# Altium schematic symbol library BARKO_SCHLIB.SchLib: 1064 symbols (part 4 of 11) (continued)
## IC-ADC124S021CIMM/NOPB (continued)
IC ADC 12BIT SAR 10VSSOP; Manufacturer: TI National Semiconductor; Manufacturer Part Number: ADC124S021CIMM/NOPB; Interface: SPI,Serial; Number of A/D Converters: 1; Max Power Dissipation: 11mW; Max Supply Voltage: 5.25V; Min Supply Voltage: 2.7V; Number of Bits: 12; Sampling Rate: 200KS/s; Number of Inputs: 4; Resolution: 12b; Polarity: Unipolar; Signal to Noise Ratio (SNR): 72dB; Operating Supply Voltage: 5V; Nominal Supply Current: 1.5mA; Integral Nonlinearity (INL): -1.1LSB; Power Consumption: 2.2mW; Supplier 1: Digi-Key; Supplier Part Number 1: ADC124S021CIMM/NOPBCT-ND; Stock: 11575; Pricing: 1=3.45, 10=3.094, 25=2.9252, 100=2.405, 250=2.158, 500=2.08 (USD); RoHS: Yes; Mount: Surface Mount; Case/Package: MSOP; Number of Pins: 10; Min Operating Temperature: -40°C; Max Operating Temperature: 85°C; Package Quantity: 1000; Power Dissipation: 11mW; Number of Analog Inputs: 4; Packaging: Tape and Reel; Number of Channels: 4; Number of Converters: 1; Number of Elements: 1; Termination: SMD/SMT; Conversion Rate: 200KS/s; Length: 3mm; Height: 0.86mm; Width: 3mm; Radiation Hardening: No; REACH SVHC: No SVHC; Lead Free: Lead Free; ComponentLink1URL: https://datasheet.ciiva.com/3037/adc124s021-3037889.pdf?src-supplier=Avnet; ComponentLink1Description: https://datasheet.ciiva.com/3037/adc124s021-3037889.pdf?src-supplier=Avnet; ComponentLink2URL: https://datasheet.ciiva.com/41460/001186665-da-01-en-ic-adc-1-adc124s021cimm-nopb-msop-10-tid-41460960.pdf?src-supplier=Conrad; ComponentLink2Description: https://datasheet.ciiva.com/41460/001186665-da-01-en-ic-adc-1-adc124s021cimm-nopb-msop-10-tid-41460960.pdf?src-supplier=Conrad; ComponentLink3URL: https://datasheet.ciiva.com/7988/1919066-7988869.pdf?src-supplier=Element14; ComponentLink3Description: https://datasheet.ciiva.com/7988/1919066-7988869.pdf?src-supplier=Element14; ComponentLink4URL: https://datasheet.ciiva.com/25992/adc124s021-25992264.pdf?src-supplier=Avnet+Europe; ComponentLink4Description: https://datasheet.ciiva.com/25992/adc124s021-25992264.pdf?src-supplier=Avnet+Europe; ComponentLink5URL: https://datasheet.ciiva.com/6666/adc124s021-6666364.pdf?src-supplier=Digi-Key; ComponentLink5Description: https://datasheet.ciiva.com/6666/adc124s021-6666364.pdf?src-supplier=Digi-Key; ComponentLink6URL: https://datasheet.ciiva.com/6666/adc124s021-6666366.pdf?src-supplier=Digi-Key; ComponentLink6Description: https://datasheet.ciiva.com/6666/adc124s021-6666366.pdf?src-supplier=Digi-Key; ComponentLink7URL: https://datasheet.ciiva.com/6666/adc124s021-6666367.pdf?src-supplier=Digi-Key; ComponentLink7Description: https://datasheet.ciiva.com/6666/adc124s021-6666367.pdf?src-supplier=Digi-Key
footprint VSSOP-10 (TSSOP, 10-Leads, Body 3x3mm, Pitch 0.5mm, IPC Low Density)
pins: 1 ~{CS} (in), 2 VA (power), 3 GND (power), 4 IN4 (in), 5 IN3 (in), 6 IN2 (in), 7 IN1 (in), 8 DIN (in), 9 DOUT (out), 10 SCLK (in)

## IC-ADP7142ACPZN-R7
designator IC?, comment ADP7142ACPZN-R7
LDO Regulator Pos 1.5V to 5V 0.2A 6-Pin LFCSP EP T/R; Manufacturer: Analog Devices; Number of Outputs: 1; Max Input Voltage: 40V; Input Bias Current: 1uA; Min Input Voltage: 2.7V; Operating Supply Current: 180uA; Power Supply Rejection Ratio (PSRR): 50dB; Output Type: Adjustable; Polarity: Positive; Quiescent Current: 140uA; Accuracy: 0.8%; Max Output Current: 200mA; Output Voltage: 39.8V; Dropout Voltage: 200mV; Min Current Limit: 250mA; Supplier 1: Mouser; Manufacturer Part Number: ADP7142ACPZN-R7; Stock 1: 18194; Pricing 1: 1=2,91000, 10=2,61000, 25=2,47000, 100=2,03000, 250=1,82000, 500=1,76000 (USD); RoHS: Yes; Mount: Surface Mount; Number of Pins: 6; Contact Plating: Gold; Min Operating Temperature: -40°C; Max Operating Temperature: 125°C; Package Quantity: 3000; Packaging: Tape and Reel; Output Current: 200mA; Number of Regulators: 1; Lead Free: Contains Lead; ComponentLink1URL: http://www.mouser.com/ds/2/609/ADP7142-878904.pdf?src-supplier=Mouser; ComponentLink1Description: http://www.mouser.com/ds/2/609/ADP7142-878904.pdf?src-supplier=Mouser; ComponentLink2URL: https://www.analog.com/media/en/technical-documentation/data-sheets/ADP7142.pdf?src-supplier=Digi-Key; ComponentLink2Description: https://www.analog.com/media/en/technical-documentation/data-sheets/ADP7142.pdf?src-supplier=Digi-Key; ComponentLink3URL: http://www.analog.com/static/imported-files/data_sheets/ADP7142.pdf?src-supplier=Avnet; ComponentLink3Description: http://www.analog.com/static/imported-files/data_sheets/ADP7142.pdf?src-supplier=Avnet; Supplier Part Number 1: 584-ADP7142ACPZN-R7
footprint LFCSP CP-6-3 (6-Lead Lead Frame Chip Scale Package [LFCSP]  2.00 mm × 2.00 mm Body and 0.55 mm Package Height)
pins: 1 VOUT, 2 SNS/ADJ, 3 GND, 4 EN, 5 SS, 6 VIN, 7 EP

## IC-ADS1120IRVAT
designator IC?, comment ADS1120IRVAT
IC ADC CONV 16BIT LP LN 16VQFN; Manufacturer: Texas Instruments; Number of Bits: 16; Sampling Rate: 2000S/s; Number of A/D Converters: 1; Resolution: 16b; Polarity: Bipolar,Unipolar; Supply Type: Analog,Digital; Max Supply Voltage: 5.5V; Dual Supply Voltage: 2.5V; Max Dual Supply Voltage: 2.75V; Power Dissipation: 2.1mW; Min Supply Voltage: 2.3V; Number of Inputs: 4; Interface: SPI; Supplier 1: Arrow; Manufacturer Part Number: ADS1120IRVAT; Stock 1: 95; Pricing 1: 1=4,43700, 10=4,32800, 25=4,25300, 250=4,94100, 2500=4,83200, 25000=4,19000, 125000=3,84500, 250000=3,84200 (USD); RoHS: Yes; Mount: Surface Mount; Case/Package: VQFN; Number of Pins: 16; Contact Plating: Gold; Min Operating Temperature: -40°C; Max Operating Temperature: 125°C; Min Dual Supply Voltage: 2.3V; Package Quantity: 250; Packaging: Cut Tape; Lead Free: Lead Free; ComponentLink1URL: https://datasheet.ciiva.com/29661/ads1120-29661123.pdf?src-supplier=Digi-Key; ComponentLink1Description: https://datasheet.ciiva.com/29661/ads1120-29661123.pdf?src-supplier=Digi-Key; ComponentLink2URL: https://datasheet.ciiva.com/48514/ads1120-48514092.pdf?src-supplier=Avnet; ComponentLink2Description: https://datasheet.ciiva.com/48514/ads1120-48514092.pdf?src-supplier=Avnet; Supplier Part Number 1: ADS1120IRVAT
footprint S-PVQFN-N16 (QFN, 16-Leads, Body 3,50x3,50mm, Pitch 0,50mm, Thermal Pad 2,14x2,14mm, IPC Medium Density)
pins: 1 CLK, 2 DGND (power), 3 AVSS (power), 4 AIN3/REFN1, 5 AIN2, 6 REFNO, 7 REFPO, 8 AIN1, 9 AIN0/REFP1, 10 AVDD (power), 11 DVDD (power), 12 ~{DRDY}, 13 DOUT/~{DRDY}, 14 DIN, 15 SCLK, 16 ~{CS}, 17 EP (power)

## IC-AND-SN74LVC1G08DCKR
designator U?, comment SN74LVC1G08DCKR
IC GATE AND 1CH 2-INP SC70-5; Manufacturer: Texas Instruments; Min Supply Voltage: 1.65V; Max Supply Voltage: 5.5V; Propagation Delay: 4ns; Number of Inputs: 2; Number of Outputs: 1; Low Level Output Current: 32mA; Quiescent Current: 10uA; High Level Output Current: -32mA; Schmitt Trigger Input: No; Washability: OK; .Creator: M.OZKAN; .PCBCHK: USED; Manufacturer Part Number: SN74LVC1G08DCKR; RoHS: Yes; Mount: Surface Mount; Case/Package: SC; Number of Pins: 5; Weight: 8.8E-05oz; Contact Plating: Gold; Min Operating Temperature: -40°C; Max Operating Temperature: 125°C; Logic Function: AND; Packaging: Tape and Reel; Package Quantity: 1; Number of Gates: 1; Number of Input Lines: 2; Number of Output Lines: 1; Number of Circuits: 1; Number of Elements: 1; Turn-On Delay Time: 4ns; Number of Bits: 1; Output Current: 32mA; Max Output Current: 32mA; Termination: SMD/SMT; Length: 2.15mm; Height: 1mm; Width: 1.4mm; Radiation Hardening: No; REACH SVHC: No SVHC; Lead Free: Lead Free; Supplier 1: Digi-Key; Supplier Part Number 1: 296-11602-1-ND; Stock 1: 120042; Pricing 1: 1=0.27000, 10=0.22100, 25=0.18560, 100=0.11740, 250=0.09064, 500=0.07726, 1000=0.05253 (USD); ComponentLink1URL: https://datasheet.ciiva.com/14290/sn74lvc1g08-14290720.pdf?src-supplier=Avnet; ComponentLink1Description: https://datasheet.ciiva.com/14290/sn74lvc1g08-14290720.pdf?src-supplier=Avnet; ComponentLink2URL: https://datasheet.ciiva.com/1864/sn74lvc1g08-1864341.pdf?src-supplier=Digi-Key; ComponentLink2Description: https://datasheet.ciiva.com/1864/sn74lvc1g08-1864341.pdf?src-supplier=Digi-Key; ComponentLink3URL: https://datasheet.ciiva.com/1864/sn74lvc1g08-1864342.pdf?src-supplier=Digi-Key; ComponentLink3Description: https://datasheet.ciiva.com/1864/sn74lvc1g08-1864342.pdf?src-supplier=Digi-Key; ComponentLink4URL: https://datasheet.ciiva.com/1864/sn74lvc1g08-1864343.pdf?src-supplier=Digi-Key; ComponentLink4Description: https://datasheet.ciiva.com/1864/sn74lvc1g08-1864343.pdf?src-supplier=Digi-Key; ComponentLink5URL: https://datasheet.ciiva.com/26048/sn74lvc1g08-26048426.pdf?src-supplier=Avnet+Europe; ComponentLink5Description: https://datasheet.ciiva.com/26048/sn74lvc1g08-26048426.pdf?src-supplier=Avnet+Europe; ComponentLink6URL: https://datasheet.ciiva.com/16503/sn74lvc1g08-16503404.pdf?src-supplier=Avnet+Asia; ComponentLink6Description: https://datasheet.ciiva.com/16503/sn74lvc1g08-16503404.pdf?src-supplier=Avnet+Asia; ComponentLink7URL: https://datasheet.ciiva.com/14290/sn74lvc1g08-14290717.pdf?src-supplier=Avnet; ComponentLink7Description: https://datasheet.ciiva.com/14290/sn74lvc1g08-14290717.pdf?src-supplier=Avnet; ComponentLink8URL: https://datasheet.ciiva.com/28540/1772545-28540798.pdf?src-supplier=Element14; ComponentLink8Description: https://datasheet.ciiva.com/28540/1772545-28540798.pdf?src-supplier=Element14; .SCHCHK: USED
footprint TSSOP5 (SOT23, 5-Leads, Body 2.15x1.4mm, Pitch 0.65mm, IPC High Density)
pins: 1 A (in) "Input A", 2 B (in) "Input B", 3 GND (power) "Ground Pin", 4 Y (out) "Input A", 5 VCC (power) "Power Pin"

## IC-AOZ1282CI
designator U?, comment AOZ1282CI  Package: SOT23-6
IC REG BUCK ADJ 1.2A SOT23-6; Manufacturer: Alpha & Omega Semiconductor; Number of Outputs: 1; Min Input Voltage: 4.5V; Max Input Voltage: 36V; Min Output Voltage: 800mV; Switching Frequency: 450kHz; Synchronous Rectifier: No; Output Type: Adjustable; Output Configuration: Positive; .PCBCHK: USED; .Creator: F:TALI; Washability: OK; Supplier 1: Digi-Key; Stock 1: 332367; Pricing 1: 1=0.89, 10=0.779, 25=0.6896, 100=0.6007, 250=0.52284, 500=0.44496, 1000=0.35597 (USD); Mount: Surface Mount; Number of Pins: 6; Min Operating Temperature: -40°C; Max Operating Temperature: 85°C; Packaging: Tape and Reel; Max Output Voltage: 36V; Output Current: 1.2A; Package Quantity: 1; Output Voltage: 36V; Lead Free: Lead Free; ComponentLink1URL: http://aosmd.com/res/data_sheets/AOZ1282CI.pdf; ComponentLink1Description: http://aosmd.com/res/data_sheets/AOZ1282CI.pdf; ComponentLink2URL: http://components.arrow.com/part/dataview/0323_06084387; ComponentLink2Description: http://components.arrow.com/part/dataview/0323_06084387; Supplier Part Number 1: 785-1613-6-ND; .SCHCHK: USED; Manufacturer Part Number: AOZ1282CI; RoHS: Yes; Case/Package: SOT-23-6; ComponentLink3URL: https://datasheet.ciiva.com/15081/aoz1282ci-15081829.pdf?src-supplier=Digi-Key; ComponentLink3Description: https://datasheet.ciiva.com/15081/aoz1282ci-15081829.pdf?src-supplier=Digi-Key; ComponentLink4URL: https://datasheet.ciiva.com/15268/1934aoz1282ci-15268300.pdf?src-supplier=Arrow+Europe; ComponentLink4Description: https://datasheet.ciiva.com/15268/1934aoz1282ci-15268300.pdf?src-supplier=Arrow+Europe; ComponentLink5URL: https://datasheet.ciiva.com/18553/aoz1282ci-18553035.pdf?src-supplier=Digi-Key; ComponentLink5Description: https://datasheet.ciiva.com/18553/aoz1282ci-18553035.pdf?src-supplier=Digi-Key; ComponentLink6URL: https://datasheet.ciiva.com/18553/aoz1282ci-18553036.pdf?src-supplier=Digi-Key; ComponentLink6Description: https://datasheet.ciiva.com/18553/aoz1282ci-18553036.pdf?src-supplier=Digi-Key; ComponentLink7URL: https://datasheet.ciiva.com/18553/aoz1282ci-18553037.pdf?src-supplier=Digi-Key; ComponentLink7Description: https://datasheet.ciiva.com/18553/aoz1282ci-18553037.pdf?src-supplier=Digi-Key
footprint SOT23-6L
pins: 1 BS (in), 2 GND (power), 3 FB (in), 4 EN (in), 5 IN (power), 6 LX (out)

## IC-AP2210N-5.0TRG1
designator IC?, comment REG LINEAR 5V 300MA
IC REG LINEAR 5V 300MA SOT23-3; Manufacturer: Diodes; Manufacturer Part Number: AP2210N-5.0TRG1; Polarity: Positive; Quiescent Current: 180uA; Accuracy: 1%; Number of Outputs: 1; Max Input Voltage: 13.2V; Min Input Voltage: 2.5V; Dropout Voltage: 500mV; Max Supply Current: 15mA; Power Supply Rejection Ratio (PSRR): 75dB; Output Type: Fixed; Supplier 1: Mouser; Stock 1: 42905; Pricing 1: 1=0,41000, 10=0,28600, 100=0,13200, 1000=0,10100, 3000=0,08600, 9000=0,07900 (USD); RoHS: Yes; Mount: Surface Mount; Case/Package: TO-236-3; Number of Pins: 3; Contact Plating: Tin; Min Operating Temperature: -40°C; Max Operating Temperature: 125°C; Max Output Current: 300mA; Packaging: Tape and Reel; Output Voltage: 5V; Output Current: 300mA; Number of Regulators: 1; Output Configuration: Positive; Min Output Voltage: 5V; ComponentLink1URL: https://datasheet.ciiva.com/70043/ap2210-70043557.pdf?src-supplier=Digi-Key; ComponentLink1Description: https://datasheet.ciiva.com/70043/ap2210-70043557.pdf?src-supplier=Digi-Key; Supplier Part Number 1: 621-AP2210N-5.0TRG1
footprint SOT23-3
pins: 1 GND, 2 OUT, 3 IN

## IC-AP6714M10G-13
designator U?, comment AP6714
IC REG BST ADJ 1.6A SYNC 10MSOP; Manufacturer: Diodes; Manufacturer Part Number: AP6714M10G-13; Efficiency: 94%; Min Input Voltage: 900mV; Max Input Voltage: 5.5V; Number of Outputs: 1; Switching Frequency: 1.8MHz; Operating Supply Current: 150uA; Min Output Voltage: 1.8V; Output Type: Adjustable; Synchronous Rectifier: Yes; Output Configuration: Positive; Topology: Boost; Washability: OK; .Creator: M.OZKAN; .PCBCHK: USED; Supplier 1: Digi-Key; Supplier Part Number 1: AP6714M10GDICT-ND; Stock 1: 566; Pricing 1: 1=0.88000, 10=0.77200, 25=0.72560, 100=0.54990, 250=0.46800, 500=0.44460, 1000=0.33930 (USD); RoHS: Yes; Mount: Surface Mount; Case/Package: MSOP; Number of Pins: 10; Weight: 0.005051oz; Contact Plating: Tin,Matte; Min Operating Temperature: -40°C; Max Operating Temperature: 85°C; Output Voltage: 5.5V; Max Output Current: 1.6A; Min Supply Voltage: 900mV; Max Output Voltage: 5.5V; Output Current: 1.6A; Packaging: Tape and Reel; Package Quantity: 1; Length: 2.95mm; Height: 0.95mm; Width: 2.95mm; Radiation Hardening: No; Lead Free: Lead Free; REACH SVHC: No SVHC; ComponentLink1URL: https://datasheet.ciiva.com/17293/ap6714-17293987.pdf?src-supplier=Avnet+Europe; ComponentLink1Description: https://datasheet.ciiva.com/17293/ap6714-17293987.pdf?src-supplier=Avnet+Europe; ComponentLink2URL: https://datasheet.ciiva.com/4879/ap6714-7414-4879290.pdf?src-supplier=Mouser; ComponentLink2Description: https://datasheet.ciiva.com/4879/ap6714-7414-4879290.pdf?src-supplier=Mouser; ComponentLink3URL: https://datasheet.ciiva.com/3222/ap6714-3222077.pdf?src-supplier=Avnet; ComponentLink3Description: https://datasheet.ciiva.com/3222/ap6714-3222077.pdf?src-supplier=Avnet; ComponentLink4URL: https://datasheet.ciiva.com/2023/ap6714-2023934.pdf?src-supplier=Digi-Key; ComponentLink4Description: https://datasheet.ciiva.com/2023/ap6714-2023934.pdf?src-supplier=Digi-Key; ComponentLink5URL: https://datasheet.ciiva.com/2023/ap6714-2023933.pdf?src-supplier=Digi-Key; ComponentLink5Description: https://datasheet.ciiva.com/2023/ap6714-2023933.pdf?src-supplier=Digi-Key; ComponentLink6URL: https://datasheet.ciiva.com/2023/ap6714-2023935.pdf?src-supplier=Digi-Key; ComponentLink6Description: https://datasheet.ciiva.com/2023/ap6714-2023935.pdf?src-supplier=Digi-Key; .SCHCHK: USED
footprint MSOP10 (TSSOP, 10-Leads, Body 3,00x3,00mm, Pitch 0,50mm, IPC Medium Density)
pins: 1 VCC, 2 EN, 3 CC, 4 FB, 5 REF, 6 SGND, 7 PGND, 8 OCP, 9 LX, 10 OUT

## IC-AP7363-HA-7
designator U?, comment AP7363
IC REG LIN POS ADJ 1.5A 8DFN; Manufacturer: Diodes; Manufacturer Part Number: AP7363-HA-7; Dropout Voltage: 190mV; Number of Outputs: 1; Min Input Voltage: 2.2V; Max Input Voltage: 5.5V; Output Voltage: 5V; Output Type: Adjustable; Min Output Voltage: 600mV; Polarity: Positive; Accuracy: 1.5%; Supplier 1: Digi-Key; Supplier Part Number 1: AP7363-HA-7DICT-ND; Stock: 9906; Pricing: 1=0.53, 10=0.455, 25=0.4244, 100=0.3151, 250=0.2666, 500=0.2545, 1000=0.1879 (USD); RoHS: Yes; Mount: Surface Mount; Case/Package: TO-252-3; Number of Pins: 8; Weight: 0.139332oz; Min Operating Temperature: -40°C; Max Operating Temperature: 85°C; Output Current: 1.5A; Package Quantity: 3000; Packaging: Tape and Reel; Max Output Current: 1.5A; Number of Regulators: 1; Max Output Voltage: 5V; Radiation Hardening: No; REACH SVHC: No SVHC; ComponentLink1URL: https://datasheet.ciiva.com/8078/1636611-8078229.pdf?src-supplier=Element14; ComponentLink1Description: https://datasheet.ciiva.com/8078/1636611-8078229.pdf?src-supplier=Element14; ComponentLink2URL: https://datasheet.ciiva.com/30016/ap7363-30016557.pdf?src-supplier=Avnet; ComponentLink2Description: https://datasheet.ciiva.com/30016/ap7363-30016557.pdf?src-supplier=Avnet; ComponentLink3URL: https://datasheet.ciiva.com/29568/ap7363-29568764.pdf?src-supplier=Digi-Key; ComponentLink3Description: https://datasheet.ciiva.com/29568/ap7363-29568764.pdf?src-supplier=Digi-Key
footprint 8-UFDFN EP (SON, 8-Leads, Body 2x2mm, Pitch 0.5mm, Thermal Pad 1.6x1mm)
pins: 1 GND_1 (in), 2 VIN_1, 3 VIN_2, 4 VIN_3, 5 VOUT_1, 6 VOUT_2, 7 VOUT_3, 8 ADJ, 9 GND_2 (in)
text: LDO

## IC-AP9101C
designator U?, comment AP9101C
IC BATT PROT LI-ION 1-CELL SOT26; Manufacturer: Diodes; Manufacturer Part Number: AP9101CK6-AYTRG1; Washability: OK; .Creator: M.OZKAN; .PCBCHK: USED; RoHS: No; Case/Package: SOT-23-6; Packaging: Tape and Reel; ComponentLink1URL: https://www.diodes.com/assets/Datasheets/AP9101C.pdf?src-supplier=Digi-Key; ComponentLink1Description: https://www.diodes.com/assets/Datasheets/AP9101C.pdf?src-supplier=Digi-Key; Supplier 1: Digi-Key; Supplier Part Number 1: AP9101CK6-AYTRG1DICT-ND; Stock: 3270; Pricing: 1=0.44, 10=0.356, 25=0.3256, 100=0.2197, 250=0.1818, 500=0.1667, 1000=0.125 (USD); .SCHCHK: USED
footprint SOT23-6
pins: 1 DO, 2 VM, 3 CO, 4 NC, 5 VDD, 6 VSS

## IC-AP64350SP-13
designator U?, comment AP64350SP
DCDC CONV HV BUCK SO-8EP; Manufacturer 1: Diodes; Manufacturer Part Number: AP64350SP-13; .Creator: M.OZKAN; .PCBCHK: USED; Supplier 1: Digi-Key; RoHS: No; Stock: 3790; Pricing: 1=1,73000, 10=1,55200, 25=1,46440, 100=1,17160, 250=1,02516, 500=0,99586, 1000=0,79083 (USD); Supplier Part Number 1: 31-AP64350SP-13CT-ND; .SCHCHK: USED
footprint SOIC8-EP (SOIC, 8-Leads, Body 5x4mm, Pitch 1.27mm, IPC Low Density)
pins: 1 BST, 2 VIN, 3 EN, 4 RT/CLK, 5 FB, 6 COMP, 7 GND, 8 SW, EP GND

## IC-AT24C128C-SSHM-B
designator U?, comment AT24C128C  Case/Package: SOIC8
IC EEPROM 128K I2C 1MHZ 8SOIC; Manufacturer: Microchip / Atmel; Manufacturer Part Number: AT24C128C-SSHM-B; Access Time: 900ns; Density: 128Kb; Interface: 2-Wire,I2C,Serial; Max Supply Voltage: 5.5V; Min Supply Voltage: 1.7V; Nominal Supply Current: 3mA; Number of Words: 16384; .PCBCHK: USED; .Creator: F:TALI; Washability: OK; Supplier 1: Digi-Key; Stock 1: 1826; Pricing 1: 1=0.45, 10=0.443, 25=0.4116, 100=0.3636 (USD); Mount: Surface Mount; Number of Pins: 8; Contact Plating: Matte,Tin; Min Operating Temperature: -40°C; Max Operating Temperature: 85°C; Max Frequency: 1MHz; Frequency: 1MHz; Packaging: Bulk; Package Quantity: 100; Memory Type: EEPROM; Memory Size: 128Kb; Length: 5.05mm; Height: 1.5mm; Width: 3.99mm; Radiation Hardening: No; REACH SVHC: No SVHC; ComponentLink1URL: https://www.verical.com/server-webapp/html/getDatasheet?partID=319282; ComponentLink1Description: https://www.verical.com/server-webapp/html/getDatasheet?partID=319282; ComponentLink2URL: http://www.microchip.com/mymicrochip/filehandler.aspx?ddocname=en589922; ComponentLink2Description: http://www.microchip.com/mymicrochip/filehandler.aspx?ddocname=en589922; ComponentLink3URL: http://www.farnell.com/datasheets/1726559.pdf; ComponentLink3Description: http://www.farnell.com/datasheets/1726559.pdf; Supplier Part Number 1: AT24C128C-SSHM-B-ND; .SCHCHK: USED
footprint SOIC8
pins: 1 A0 (in), 2 A1 (in), 3 A2 (in), 4 GND (power), 5 SDA (io), 6 SCL (io), 7 WP, 8 VCC (power)

## IC-AZ1117
designator U?, comment AZ1117  (value not drawn)
IC REG LDO POSITIVE ADJ 0.8A SOT223; Manufacturer: Diodes; Manufacturer Part Number: AZ1117IH-3.3TRG1; Alternate PN: TLV1117IDCYR; Output Voltage: 3.3V; Output Current: 800mA; Dropout Voltage: 1.2V; Number of Regulators: 1; Min Current Limit: 1A; Washability: OK; .Creator: M.OZKAN; .PCBCHK: USED; RoHS: Yes; Mount: Surface Mount; Case/Package: TO-261-4; Number of Pins: 3; Min Operating Temperature: -40°C; Max Operating Temperature: 125°C; Packaging: Tape and Reel; ComponentLink1URL: https://www.diodes.com/assets/Datasheets/AZ1117I.pdf?src-supplier=Digi-Key; ComponentLink1Description: https://www.diodes.com/assets/Datasheets/AZ1117I.pdf?src-supplier=Digi-Key; Supplier 1: Digi-Key; Stock 1: 4737; Pricing 1: 1=0.62000, 10=0.54400, 100=0.41690, 500=0.32960, 1000=0.26368 (USD); Supplier Part Number 1: AZ1117IH-ADJTRG1DICT-ND; .SCHCHK: USED
footprint SOT223 (SOT,2.30mm pitch;4 pin,3.50mm W X 6.50mm L X 1.70mm H body)
pins: 1 ADJ/GND (in), 2 VOUT (power), 3 VIN (power), 4 VOUT (power)
1 alternate drawing of the same symbol
text: POSITIVE; LDO

## IC-AZ1117CH-3.3TRG1
designator U?, comment AZ1117
IC REG LINEAR 3.3V 800MA SOT223; Manufacturer: Diodes; Manufacturer Part Number: AZ1117CH-3.3TRG1; Number of Regulators: 1; Dropout Voltage: 1.2V; Output Type: Fixed; Max Input Voltage: 15V; Accuracy: 1%; Min Current Limit: 1A; Quiescent Current: 6mA; Power Supply Rejection Ratio (PSRR): 70dB; Polarity: Positive; Max Output Current: 1.35A; Reference Voltage: 1.262V; Supplier 1: Digi-Key; Supplier Part Number 1: AZ1117CH-3.3TRG1DICT-ND; Stock: 32181; Pricing: 1=0.43, 10=0.322, 25=0.2816, 100=0.1608, 250=0.1508, 500=0.1206, 1000=0.0925 (USD); RoHS: Yes; Mount: Surface Mount; Case/Package: SOT-223; Number of Pins: 4; Min Operating Temperature: -20°C; Max Operating Temperature: 125°C; Output Current: 800mA; Packaging: Tape and Reel; Output Voltage: 3.3V; Number of Outputs: 1; Package Quantity: 4000; Length: 6.7mm; Height: 1.7mm; Width: 3.7mm; Lead Free: Lead Free; ComponentLink1URL: https://datasheet.ciiva.com/29569/az1117c-29569913.pdf?src-supplier=Digi-Key; ComponentLink1Description: https://datasheet.ciiva.com/29569/az1117c-29569913.pdf?src-supplier=Digi-Key; ComponentLink2URL: https://datasheet.ciiva.com/29569/az1117c-29569915.pdf?src-supplier=Digi-Key; ComponentLink2Description: https://datasheet.ciiva.com/29569/az1117c-29569915.pdf?src-supplier=Digi-Key; ComponentLink3URL: https://datasheet.ciiva.com/29569/az1117c-29569914.pdf?src-supplier=Digi-Key; ComponentLink3Description: https://datasheet.ciiva.com/29569/az1117c-29569914.pdf?src-supplier=Digi-Key
footprint SOT223 (SOT,2.30mm pitch;4 pin,3.50mm W X 6.50mm L X 1.70mm H body)
pins: 1 GND (in), 2 VOUT (power), 3 VIN (power), 4 VOUT (power)
text: LDO

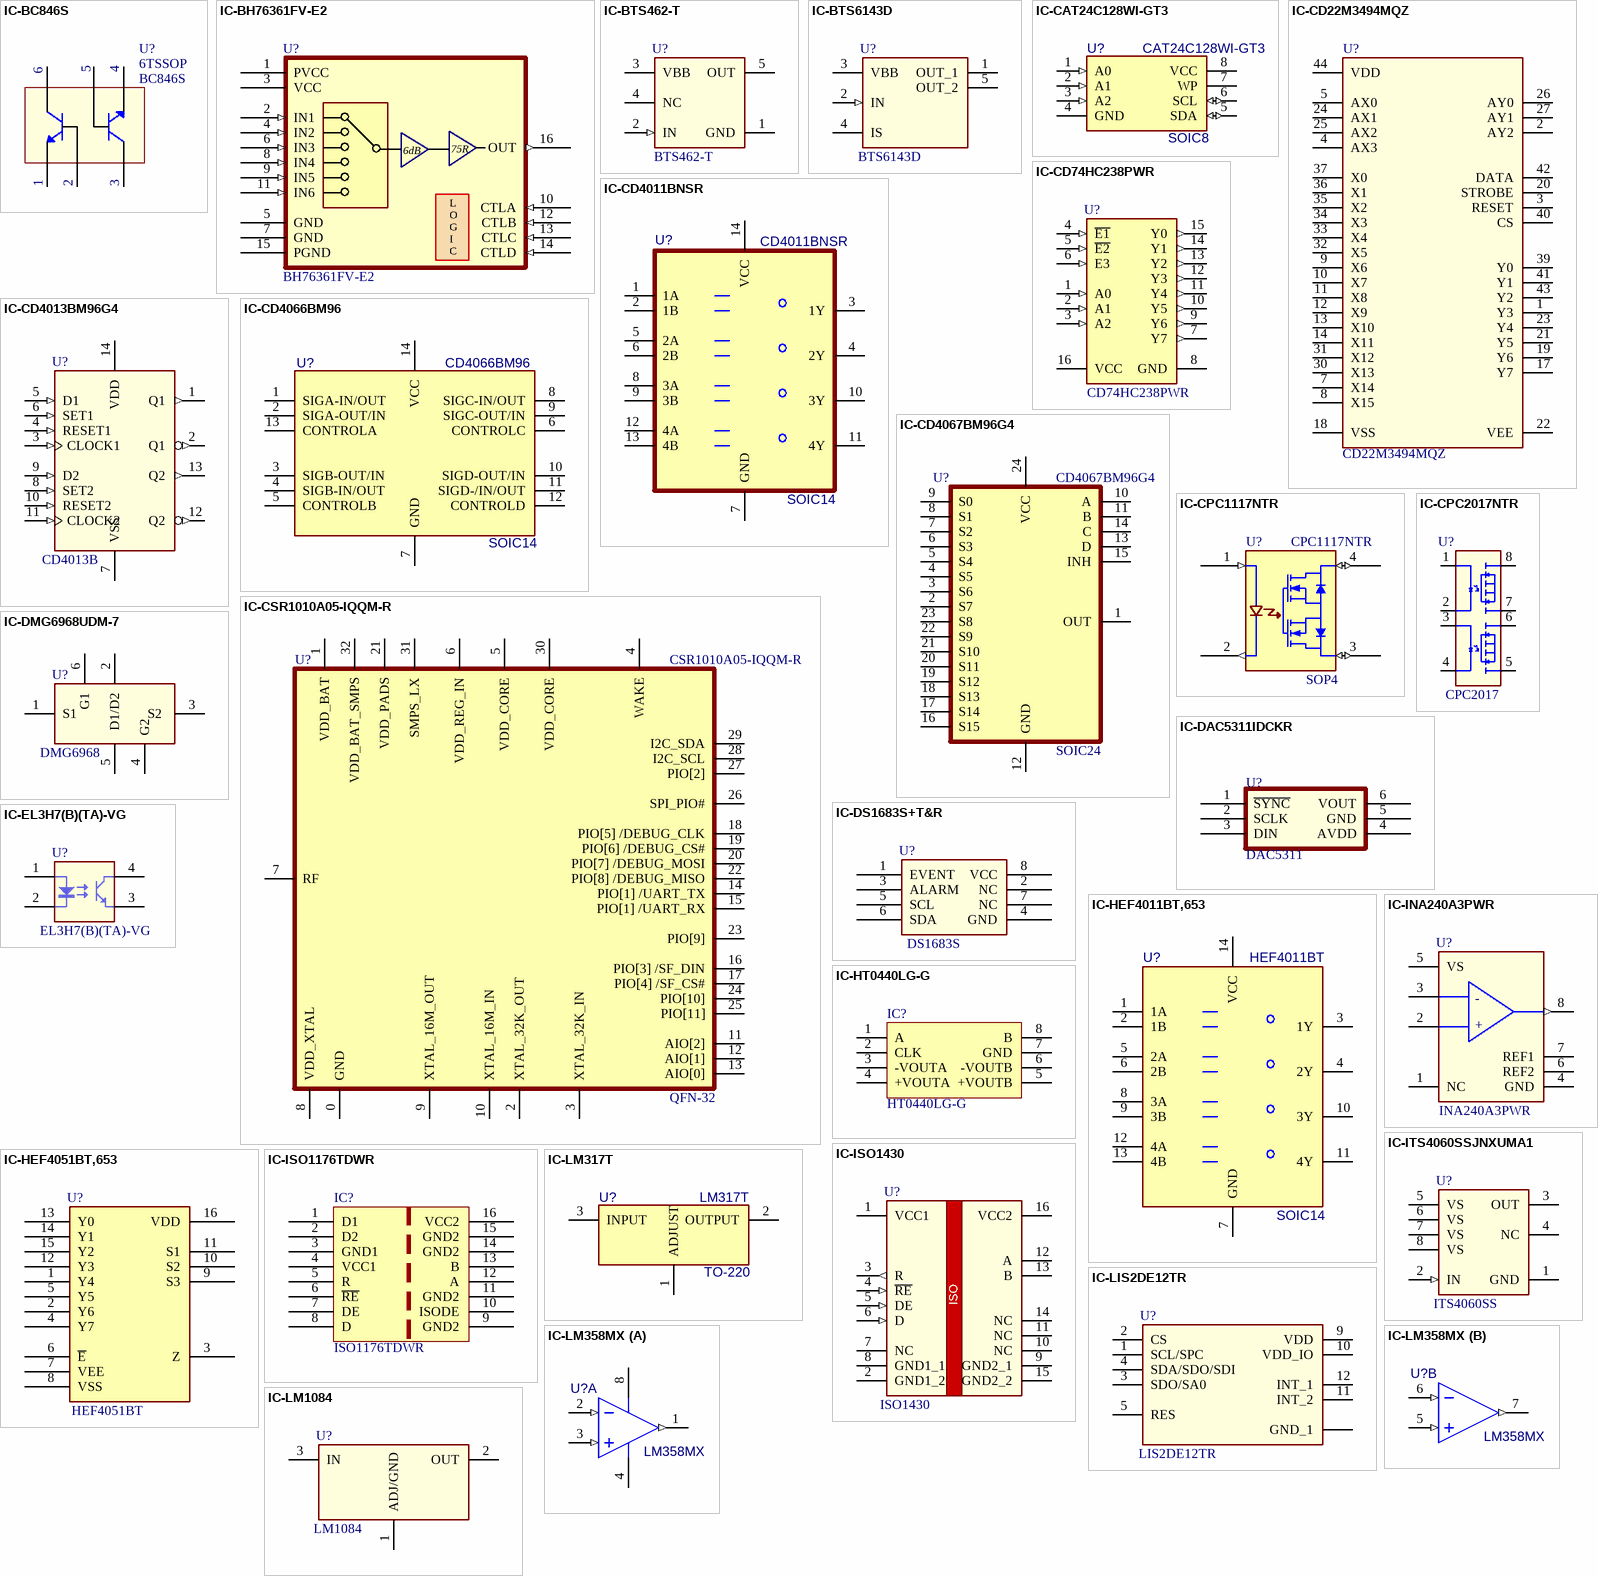
[diagram p13: symbols IC-BC846S to IC-LM1084]

## IC-BC846S
designator U?, comment Case/Package: 6TSSOP  (hidden comment: BC846S)
TRANS 2NPN 40V 0.1A 6TSSOP; Manufacturer: NXP Semiconductors; Max Power Dissipation: 200mW; Max Collector Current: 100mA; Collector Base Voltage (VCBO): 50V; Frequency: 100MHz; Polarity: NPN; Emitter Base Voltage (VEBO): 5V; Number of Elements: 2; Test Current: 5mA; Zener Voltage: 5.1V; Element Configuration: Dual; Current: 1A; Washability: OK; .Creator: M.OZKAN; .PCBCHK: USED; Supplier 1: Digi-Key; Stock 1: 0; RoHS: Yes; Mount: Surface Mount; Number of Pins: 6; Min Operating Temperature: -65°C; Max Operating Temperature: 150°C; Collector Emitter Voltage (VCEO): 40V; Package Quantity: 1; Packaging: Tape and Reel; Transition Frequency: 100MHz; Collector Emitter Breakdown Voltage: 40V; Max Breakdown Voltage: 40V; Power Dissipation: 200mW; Termination: SMD/SMT; Gain Bandwidth Product: 100MHz; Voltage: 40V; Radiation Hardening: No; REACH SVHC: No SVHC; Lead Free: Lead Free; ComponentLink1URL: https://datasheet.ciiva.com/4722/pumz1-104831-4722227.pdf?src-supplier=Mouser; ComponentLink1Description: https://datasheet.ciiva.com/4722/pumz1-104831-4722227.pdf?src-supplier=Mouser; ComponentLink2URL: https://datasheet.ciiva.com/6366/pumz1-6366963.pdf?src-supplier=Digi-Key; ComponentLink2Description: https://datasheet.ciiva.com/6366/pumz1-6366963.pdf?src-supplier=Digi-Key; ComponentLink3URL: https://datasheet.ciiva.com/968/pumz1-968100.pdf?src-supplier=Digi-Key; ComponentLink3Description: https://datasheet.ciiva.com/968/pumz1-968100.pdf?src-supplier=Digi-Key; ComponentLink4URL: https://datasheet.ciiva.com/6366/pumz1-6366965.pdf?src-supplier=Digi-Key; ComponentLink4Description: https://datasheet.ciiva.com/6366/pumz1-6366965.pdf?src-supplier=Digi-Key; ComponentLink5URL: https://datasheet.ciiva.com/1259/pimz2-pumz2-1259478.pdf?src-supplier=Newark; ComponentLink5Description: https://datasheet.ciiva.com/1259/pimz2-pumz2-1259478.pdf?src-supplier=Newark; ComponentLink6URL: https://datasheet.ciiva.com/11201/pumz1-11201527.pdf?src-supplier=Avnet; ComponentLink6Description: https://datasheet.ciiva.com/11201/pumz1-11201527.pdf?src-supplier=Avnet; ComponentLink7URL: https://datasheet.ciiva.com/16615/pumz1-16615180.pdf?src-supplier=Avnet+Europe; ComponentLink7Description: https://datasheet.ciiva.com/16615/pumz1-16615180.pdf?src-supplier=Avnet+Europe; Supplier Part Number 1: 568-6556-1-ND; Manufacturer Part Number: BC846S; .SCHCHK: USED
footprint SOT-363
pins: 1, 2, 3, 4, 5, 6

## IC-BH76361FV-E2
designator U?, comment BH76361FV-E2
IC AMP MPLEX AMP 16SSOP; Manufacturer 1: Rohm; Number of Channels: 1; Nominal Supply Current: 10mA; Washability: OK; .Creator: M.OZKAN; .PCBCHK: USED; Supplier 1: Digi-Key; Manufacturer Part Number 1: BH76361FV-E2; Stock 1: 1651; Pricing 1: 1=3,22000, 10=2,89300, 25=2,73480, 100=2,37000, 250=2,24848, 500=2,01756, 1000=1,70156 (USD); RoHS: Yes; Mount: Surface Mount; Case/Package: LSSOP; Number of Pins: 16; Contact Plating: Copper,Tin; Min Operating Temperature: -40°C; Max Operating Temperature: 85°C; Packaging: Tape and Reel; Package Quantity: 2500; Number of Circuits: 1; Operating Supply Current: 10mA; Radiation Hardening: No; Lead Free: Lead Free; ComponentLink1URL: https://datasheet.ciiva.com/15120/getdatasheetpartid-457541-15120107.pdf?src-supplier=Verical; ComponentLink1Description: https://datasheet.ciiva.com/15120/getdatasheetpartid-457541-15120107.pdf?src-supplier=Verical; ComponentLink2URL: https://datasheet.ciiva.com/1823/bh76330fvm-e-1823882.pdf?src-supplier=Digi-Key; ComponentLink2Description: https://datasheet.ciiva.com/1823/bh76330fvm-e-1823882.pdf?src-supplier=Digi-Key; ComponentLink3URL: https://datasheet.ciiva.com/1823/bh76330fvm-e-1823883.pdf?src-supplier=Digi-Key; ComponentLink3Description: https://datasheet.ciiva.com/1823/bh76330fvm-e-1823883.pdf?src-supplier=Digi-Key; ComponentLink4URL: https://datasheet.ciiva.com/25921/bh76330fvm-e-25921499.pdf?src-supplier=Avnet+Europe; ComponentLink4Description: https://datasheet.ciiva.com/25921/bh76330fvm-e-25921499.pdf?src-supplier=Avnet+Europe; ComponentLink5URL: https://datasheet.ciiva.com/1823/bh76330fvm-e-1823884.pdf?src-supplier=Digi-Key; ComponentLink5Description: https://datasheet.ciiva.com/1823/bh76330fvm-e-1823884.pdf?src-supplier=Digi-Key; Supplier Part Number 1: BH76361FV-E2CT-ND; .SCHCHK: USED
footprint SSOP16
pins: 1 PVCC (power), 2 IN1 (in), 3 VCC (power), 4 IN2 (in), 5 GND (power), 6 IN3 (in), 7 GND (power), 8 IN4 (in), 9 IN5 (in), 10 CTLA (in), 11 IN6 (in), 12 CTLB (in), 13 CTLC (in), 14 CTLD (in), 15 PGND (power), 16 OUT (out)
text: 6dB; 75R; L / O / G / I / C

## IC-BTS462-T
designator U?, comment BTS462-T
IC PWR SWITCH N-CHAN 1:1 TO252-5; Manufacturer: Infineon; Output Current: 3.5A; Number of Outputs: 1; Nominal Supply Current: 1.3mA; Max Supply Voltage: 34V; Max Power Dissipation: 41.6W; Min Input Voltage: 5V; On-State Resistance: 70mR; Output Current per Channel: 4.4A; Turn-On Delay Time: 170us; Turn-Off Delay Time: 230us; Voltage: 16V; Max Output Current: 14A; Supplier 1: Digi-Key; Supplier Part Number 1: BTS462TATMA1CT-ND; Manufacturer Part Number: BTS462-T; Stock: 6462; Pricing: 1=1.98, 10=1.776, 25=1.6756, 100=1.3406, 250=1.173, 500=1.1395, 1000=0.9049 (USD); RoHS: Yes; Case/Package: TO-252-5; Number of Pins: 5; Min Operating Temperature: -40°C; Max Operating Temperature: 150°C; Number of Channels: 1; Packaging: Tape and Reel; Power Dissipation: 41.6W; Package Quantity: 2500; Max Input Voltage: 34V; Min Supply Voltage: 5V; Max Supply Current: 1.3mA; Current: 4.4A; Operating Supply Voltage: 34V; Length: 6.5mm; Height: 2.3mm; Width: 6.22mm; Radiation Hardening: No; Halogen Free: Halogen Free; Lead Free: Contains Lead; REACH SVHC: No SVHC; ComponentLink1URL: https://datasheet.ciiva.com/15109/getdatasheetpartid-413054-15109087.pdf?src-supplier=Verical; ComponentLink1Description: https://datasheet.ciiva.com/15109/getdatasheetpartid-413054-15109087.pdf?src-supplier=Verical; ComponentLink2URL: https://datasheet.ciiva.com/1957/infineon-bts462t-ds-v01-01-en-1957175.pdf?src-supplier=Digi-Key; ComponentLink2Description: https://datasheet.ciiva.com/1957/infineon-bts462t-ds-v01-01-en-1957175.pdf?src-supplier=Digi-Key; ComponentLink3URL: https://datasheet.ciiva.com/1957/infineon-bts462t-ds-v01-01-en-1957176.pdf?src-supplier=Digi-Key; ComponentLink3Description: https://datasheet.ciiva.com/1957/infineon-bts462t-ds-v01-01-en-1957176.pdf?src-supplier=Digi-Key; ComponentLink4URL: https://datasheet.ciiva.com/1957/infineon-bts462t-ds-v01-01-en-1957177.pdf?src-supplier=Digi-Key; ComponentLink4Description: https://datasheet.ciiva.com/1957/infineon-bts462t-ds-v01-01-en-1957177.pdf?src-supplier=Digi-Key
footprint TO-252-5 (DPAK, 5-Leads, Body 6.5x6.12mm, Pitch 1.14mm, IPC Medium Density)
pins: 1 GND (power) "Logic ground.", 2 IN (in) "Input, activates the power switch in case of logical high signal.", 3 VBB (power) "Positive power supply voltage.", 4 NC "Not connected.", 5 OUT (power) "Output to the load."

## IC-BTS6143D
designator U?, comment BTS6143D
IC PWR SWITCH N-CHAN 1:1 TO252-5; Manufacturer: Infineon; Output Current: 8A; Number of Outputs: 1; Max Power Dissipation: 59W; Max Supply Voltage: 38V; Supplier 1: Digi-Key; Supplier Part Number 1: BTS6143DAUMA1CT-ND; Manufacturer Part Number: BTS6143D; Stock: 19929; Pricing: 1=2.56, 10=2.296, 25=2.1664, 100=1.7332, 250=1.5166, 500=1.4732, 1000=1.1699 (USD); RoHS: Yes; Mount: Surface Mount; Case/Package: TO-252; Min Operating Temperature: -40°C; Max Operating Temperature: 150°C; Packaging: Tape and Reel; Power Dissipation: 59W; Number of Channels: 1; Radiation Hardening: No; Lead Free: Contains Lead; Halogen Free: Halogen Free; ComponentLink1URL: https://datasheet.ciiva.com/26880/bts6143d-26880342.pdf?src-supplier=IIIC; ComponentLink1Description: https://datasheet.ciiva.com/26880/bts6143d-26880342.pdf?src-supplier=IIIC; ComponentLink2URL: https://datasheet.ciiva.com/1955/infineon-bts6143d-ds-v01-00-en-1955848.pdf?src-supplier=Digi-Key; ComponentLink2Description: https://datasheet.ciiva.com/1955/infineon-bts6143d-ds-v01-00-en-1955848.pdf?src-supplier=Digi-Key; ComponentLink3URL: https://datasheet.ciiva.com/1955/infineon-bts6143d-ds-v01-00-en-1955849.pdf?src-supplier=Digi-Key; ComponentLink3Description: https://datasheet.ciiva.com/1955/infineon-bts6143d-ds-v01-00-en-1955849.pdf?src-supplier=Digi-Key; ComponentLink4URL: https://datasheet.ciiva.com/1955/infineon-bts6143d-ds-v01-00-en-1955850.pdf?src-supplier=Digi-Key; ComponentLink4Description: https://datasheet.ciiva.com/1955/infineon-bts6143d-ds-v01-00-en-1955850.pdf?src-supplier=Digi-Key; ComponentLink5URL: https://datasheet.ciiva.com/26931/getdatasheetpartid-730772-26931260.pdf?src-supplier=Verical; ComponentLink5Description: https://datasheet.ciiva.com/26931/getdatasheetpartid-730772-26931260.pdf?src-supplier=Verical; ComponentLink6URL: https://datasheet.ciiva.com/41458/001183579-da-01-en-ic-switch-pwr-hisi-bts6143d-to-252-5-inf-41458534.pdf?src-supplier=Conrad; ComponentLink6Description: https://datasheet.ciiva.com/41458/001183579-da-01-en-ic-switch-pwr-hisi-bts6143d-to-252-5-inf-41458534.pdf?src-supplier=Conrad
footprint TO-252-5 (DPAK, 5-Leads, Body 6.5x6.12mm, Pitch 1.14mm, IPC Medium Density)
pins: 1 OUT_1 (power) "Output to the load.", 2 IN (in) "Input, activates the power switch in case of logical high signal.", 3 VBB (power) "Positive power supply voltage.", 4 IS "Not connected.", 5 OUT_2 (power) "Logic ground."

## IC-CAT24C128WI-GT3
designator U?, comment CAT24C128WI-GT3  Case/Package: SOIC8
IC EEPROM 128KBIT 400KHZ 8SOIC; Manufacturer: ON Semiconductor; Access Time: 900ns; Interface: 2-Wire,I2C,Serial; Density: 128Kb; Operating Supply Voltage: 5V; Max Supply Voltage: 5.5V; Min Supply Voltage: 1.8V; Nominal Supply Current: 3mA; Number of Words: 16000; .PCBCHK: USED; .Creator: F:TALI; Washability: OK; Supplier 1: Digi-Key; Manufacturer Part Number: CAT24C128WI-GT3; Stock 1: 2370; Pricing 1: 1=0.31, 10=0.309, 100=0.2532, 500=0.24616, 1000=0.23956 (USD); Mount: Surface Mount; Number of Pins: 8; Contact Plating: Gold; Min Operating Temperature: -40°C; Max Operating Temperature: 85°C; Packaging: Tape and Reel; Package Quantity: 1; Frequency: 400kHz; Memory Type: EEPROM; Memory Size: 128Kb; Max Frequency: 400kHz; Length: 0.196inch; Height: 1.5mm; Width: 0.157inch; Radiation Hardening: No; Lead Free: Lead Free; Halogen Free: Halogen Free; ComponentLink1URL: http://www.onsemi.com/pub_link/Collateral/CAT24C128-D.PDF; ComponentLink1Description: http://www.onsemi.com/pub_link/Collateral/CAT24C128-D.PDF; ComponentLink2URL: http://www.onsemi.com/pub/Collateral/CAT24C128-D.PDF; ComponentLink2Description: http://www.onsemi.com/pub/Collateral/CAT24C128-D.PDF; ComponentLink3URL: https://www.verical.com/server-webapp/html/getDatasheet?partID=316844; ComponentLink3Description: https://www.verical.com/server-webapp/html/getDatasheet?partID=316844; Supplier Part Number 1: CAT24C128WI-GT3DKR-ND; .SCHCHK: USED
footprint SOIC8
pins: 1 A0 (in), 2 A1 (in), 3 A2 (in), 4 GND (power), 5 SDA (io), 6 SCL (io), 7 WP, 8 VCC (power)

## IC-CD22M3494MQZ
designator U?, comment CD22M3494MQZ
IC CROSSPOINT SWITCH 16X8 44PLCC; Manufacturer: Intersil; Min Supply Voltage: 4V; Max Supply Voltage: 15V; Operating Supply Voltage: 12V; On-State Resistance: 65R; Operating Supply Current: 5mA; Supply Type: Single; Washability: OK; .Creator: M.OZKAN; .PCBCHK: USED; Supplier 1: Digi-Key; Supplier Part Number 1: CD22M3494MQZ-ND; Manufacturer Part Number: CD22M3494MQZ; Stock: 1291; Pricing: 1=7.28, 10=6.579, 25=6.2732, 100=5.202, 250=4.743, 500=4.437, 1000=3.978, 2500=3.825, 5000=3.7638 (USD); RoHS: Yes; Mount: Surface Mount; Case/Package: PLCC; Number of Pins: 44; Min Operating Temperature: -40°C; Max Operating Temperature: 85°C; Package Quantity: 26; Packaging: Rail/Tube; REACH SVHC: No SVHC; Lead Free: Lead Free; ComponentLink1URL: https://datasheet.ciiva.com/16633/fn2793-16633684.pdf?src-supplier=Avnet+Europe; ComponentLink1Description: https://datasheet.ciiva.com/16633/fn2793-16633684.pdf?src-supplier=Avnet+Europe; ComponentLink2URL: https://datasheet.ciiva.com/26824/cd22m3494mqz-26824877.pdf?src-supplier=IIIC; ComponentLink2Description: https://datasheet.ciiva.com/26824/cd22m3494mqz-26824877.pdf?src-supplier=IIIC; ComponentLink3URL: https://datasheet.ciiva.com/1514/fn2793-1514669.pdf?src-supplier=Element14; ComponentLink3Description: https://datasheet.ciiva.com/1514/fn2793-1514669.pdf?src-supplier=Element14; ComponentLink4URL: https://datasheet.ciiva.com/6638/fn2793-6638251.pdf?src-supplier=Digi-Key; ComponentLink4Description: https://datasheet.ciiva.com/6638/fn2793-6638251.pdf?src-supplier=Digi-Key; .SCHCHK: USED
footprint PLCC44 (Leaded Chip Carrier, 44-Leads, Body 16.6x16.6mm, Pitch 1.27mm, IPC Low Density)
pins: 1 Y3, 2 AY2, 3 RESET, 4 AX3, 5 AX0, 7 X14, 8 X15, 9 X6, 10 X7, 11 X8, 12 X9, 13 X10, 14 X11, 17 Y7, 18 VSS, 19 Y6, 20 STROBE, 21 Y5, 22 VEE, 23 Y4, 24 AX1, 25 AX2, 26 AY0, 27 AY1, 30 X13, 31 X12, 32 X5, 33 X4, 34 X3, 35 X2, 36 X1, 37 X0, 39 Y0, 40 CS, 41 Y1, 42 DATA, 43 Y2, 44 VDD

## IC-CD74HC238PWR
designator U?, comment CD74HC238PWR
IC DECODER/DEMUX HS 3-8 16-TSSOP; Manufacturer: Texas Instruments; Number of Inputs: 3; Number of Outputs: 8; Propagation Delay: 265ns; Max Supply Voltage: 6V; Min Supply Voltage: 2V; Logic Function: Demultiplexer,Decoder; Number of Elements: 1; Rise Time: 400ns; High Level Output Current: -5.2mA; Low Level Output Current: 5.2mA; Polarity: Non-Inverting; Quiescent Current: 8uA; Supply Type: Single; Bandwidth: 28MHz; Output Current: 25mA; Washability: OK; .Creator: M.OZKAN; .PCBCHK: USED; Supplier 1: Digi-Key; Supplier Part Number 1: 296-13814-1-ND; Manufacturer Part Number: CD74HC238PWR; Stock 1: 88860; Pricing 1: 1=0.49000, 10=0.42100, 25=0.39280, 100=0.31440, 250=0.29192, 500=0.24700, 1000=0.19086 (USD); RoHS: Yes; Mount: Surface Mount; Case/Package: TSSOP; Number of Pins: 16; Weight: 0.002183oz; Contact Plating: Gold; Min Operating Temperature: -55°C; Max Operating Temperature: 125°C; Packaging: Tape and Reel; Package Quantity: 2000; Number of Input Lines: 3; Number of Output Lines: 8; Turn-On Delay Time: 265ns; Termination: SMD/SMT; Number of Circuits: 1; Number of Bits: 8; Independent Circuits: 1; Number of Channels: 1; Max Frequency: 28MHz; Output Voltage: 6V; Max Supply Current: 8uA; Length: 5mm; Height: 1.15mm; Width: 4.4mm; Radiation Hardening: No; REACH SVHC: No SVHC; Lead Free: Lead Free; ComponentLink1URL: https://datasheet.ciiva.com/1888/cd74hc138-1888752.pdf?src-supplier=Digi-Key; ComponentLink1Description: https://datasheet.ciiva.com/1888/cd74hc138-1888752.pdf?src-supplier=Digi-Key; ComponentLink2URL: https://datasheet.ciiva.com/15092/getdatasheetpartid-310028-15092428.pdf?src-supplier=Verical; ComponentLink2Description: https://datasheet.ciiva.com/15092/getdatasheetpartid-310028-15092428.pdf?src-supplier=Verical; ComponentLink3URL: https://datasheet.ciiva.com/1888/cd74hc138-1888754.pdf?src-supplier=Digi-Key; ComponentLink3Description: https://datasheet.ciiva.com/1888/cd74hc138-1888754.pdf?src-supplier=Digi-Key; ComponentLink4URL: https://datasheet.ciiva.com/14293/cd54hc238-14293194.pdf?src-supplier=Avnet; ComponentLink4Description: https://datasheet.ciiva.com/14293/cd54hc238-14293194.pdf?src-supplier=Avnet; ComponentLink5URL: https://datasheet.ciiva.com/14294/cd54hc238-14294925.pdf?src-supplier=Avnet; ComponentLink5Description: https://datasheet.ciiva.com/14294/cd54hc238-14294925.pdf?src-supplier=Avnet; ComponentLink6URL: https://datasheet.ciiva.com/1888/cd74hc138-1888753.pdf?src-supplier=Digi-Key; ComponentLink6Description: https://datasheet.ciiva.com/1888/cd74hc138-1888753.pdf?src-supplier=Digi-Key; ComponentLink7URL: https://datasheet.ciiva.com/22645/1861095-22645579.pdf?src-supplier=Element14; ComponentLink7Description: https://datasheet.ciiva.com/22645/1861095-22645579.pdf?src-supplier=Element14; ComponentLink8URL: https://datasheet.ciiva.com/22654/1762451-22654207.pdf?src-supplier=Farnell; ComponentLink8Description: https://datasheet.ciiva.com/22654/1762451-22654207.pdf?src-supplier=Farnell; .SCHCHK: USED
footprint TSSOP16
pins: 1 A0 (in), 2 A1 (in), 3 A2 (in), 4 ~{E1} (in), 5 ~{E2} (in), 6 E3 (in), 7 Y7 (out), 8 GND (power), 9 Y6 (out), 10 Y5 (out), 11 Y4 (out), 12 Y3 (out), 13 Y2 (out), 14 Y1 (out), 15 Y0 (out), 16 VCC (power)

## IC-CD4011BNSR
designator U?, comment CD4011BNSR  Case/Package: SOIC14
IC GATE NAND 4CH 2-INP 14-SO; Manufacturer: Texas Instruments; Number of Outputs: 1; Max Supply Voltage: 18V; Min Supply Voltage: 3V; Propagation Delay: 90ns; Number of Inputs: 2; Number of Circuits: 4; Quiescent Current: 1uA; High Level Output Current: 3.4mA; Turn-On Delay Time: 250ns; Output Current: 6.8mA; .PCBCHK: USED; .Creator: F:TALI; Washability: OK; Supplier 1: Digi-Key; Manufacturer Part Number: CD4011BNSR; Stock 1: 2973; Pricing 1: 1=0.46, 10=0.398, 100=0.2971, 500=0.2334, 1000=0.18035 (USD); Mount: Surface Mount; Number of Pins: 14; Weight: 0.007348oz; Contact Plating: Gold; Min Operating Temperature: -55°C; Max Operating Temperature: 125°C; Packaging: Tape and Reel; Package Quantity: 1; Logic Function: NAND; Low Level Output Current: 3.4mA; Number of Gates: 4; Number of Input Lines: 2; Number of Output Lines: 1; Number of Elements: 4; Number of Bits: 4; Lead Free: Lead Free; ComponentLink1URL: http://www.ti.com/lit/pdf/sdyu001; ComponentLink1Description: http://www.ti.com/lit/pdf/sdyu001; ComponentLink2URL: http://www.ti.com/general/docs/lit/getliterature.tsp?genericPartNumber=CD4011B-MIL&&fileType=pdf; ComponentLink2Description: http://www.ti.com/general/docs/lit/getliterature.tsp?genericPartNumber=CD4011B-MIL&&fileType=pdf; Supplier Part Number 1: 296-14085-6-ND; .SCHCHK: USED
footprint SOIC14
pins: 1 1A, 2 1B, 3 1Y, 4 2Y, 5 2A, 6 2B, 7 GND, 8 3A, 9 3B, 10 3Y, 11 4Y, 12 4A, 13 4B, 14 VCC

## IC-CD4013BM96G4
designator U?, comment CD4013B